# Altium footprint library 1.03-电容.PcbLib: 224 footprints (part 1 of 14)
Each footprint in its own frame and in the unit in brackets; x right, y up, seen from the top. Pads: shape width x height; smd on the part's side, far side on the other; paste and mask are expansions set on the pad; w line width, h text height; cw(c..) or ccw(c..) is an arc to the next point about the centre after c.
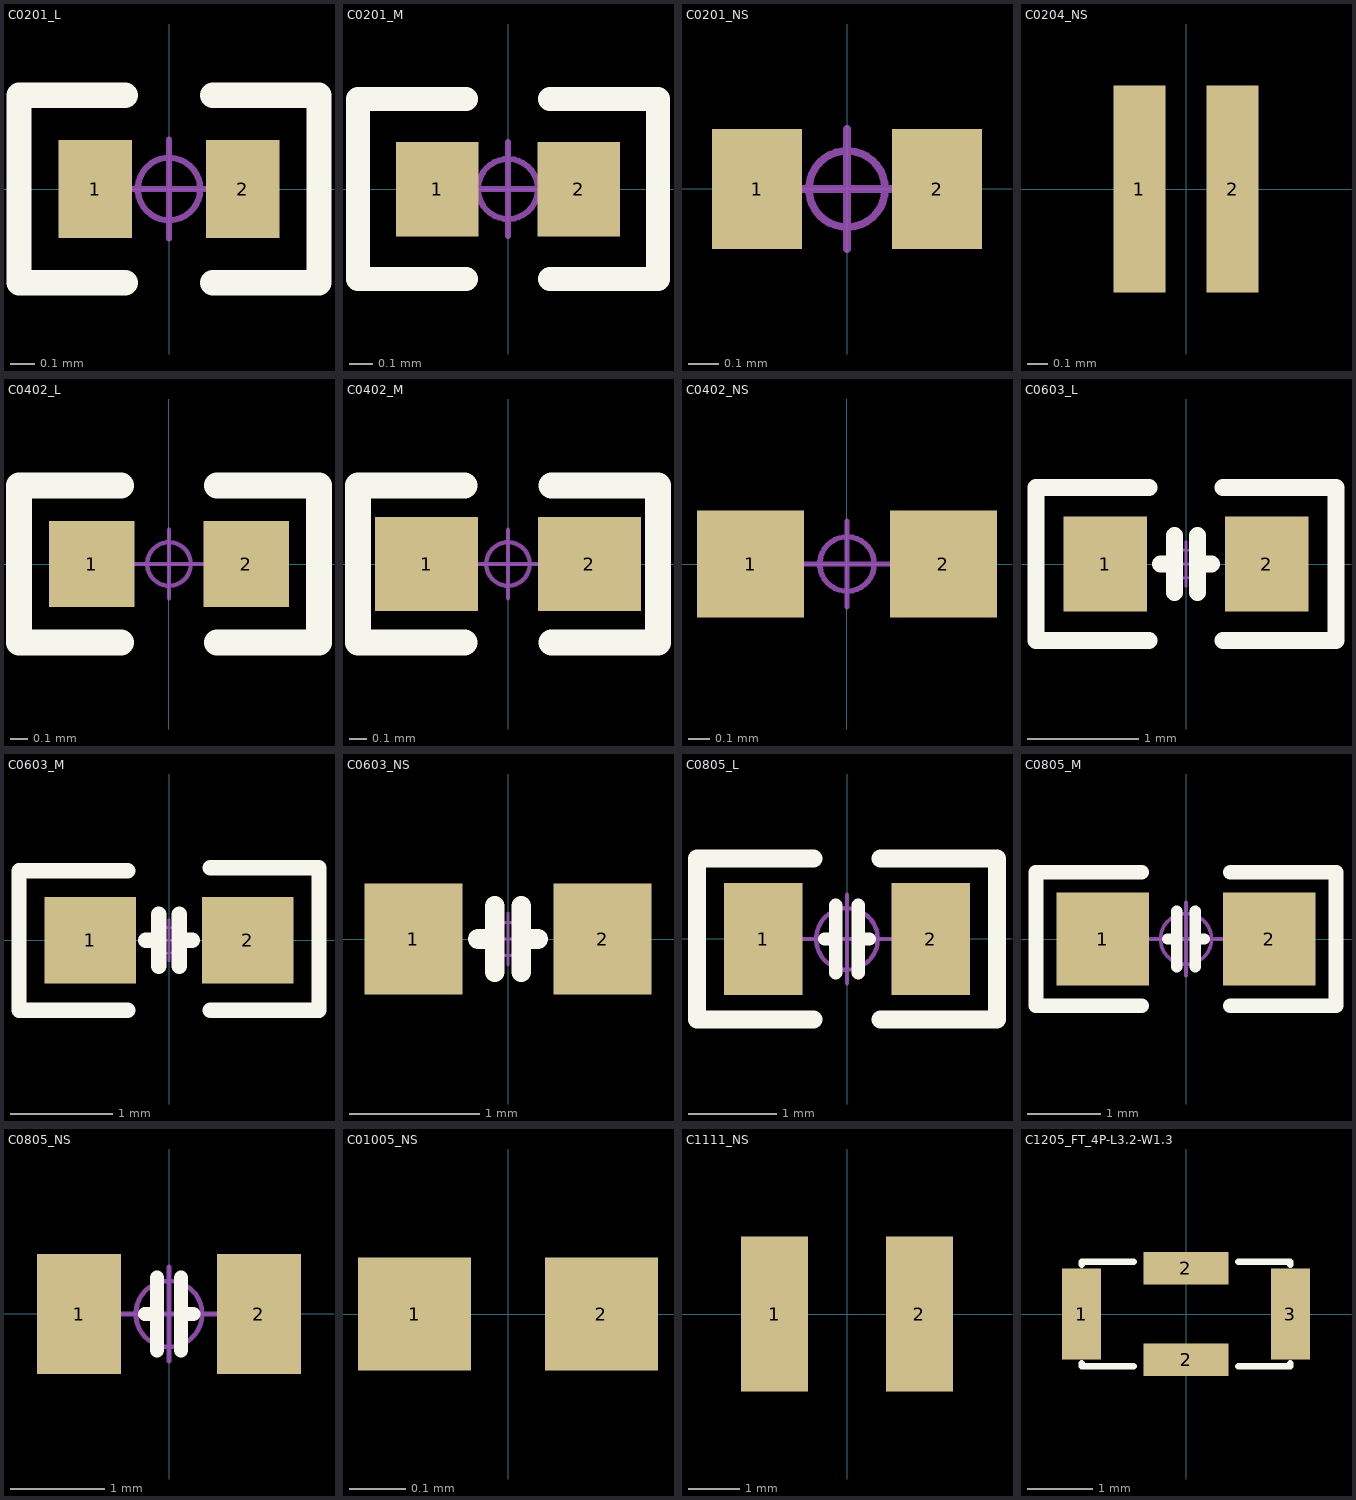
[diagram p0: the footprints below, top view; thin cyan lines are the x and y axes]

## C0201_L [mm] "贴片MLCC电容"
pads (2):
  rect 0.3x0.4 smd: 1(-0.3,0) 2(0.3,0)
Top Overlay:
  lines w0.102: -0.178,-0.381 -0.61,-0.381 -0.61,0.381 -0.178,0.381 ; 0.178,-0.381 0.61,-0.381 0.61,0.381 0.178,0.381
Mechanical 15:
  circle w0.025: c0,0 r0.127
  lines w0.025: -0.2,0 0.2,0 ; 0,-0.2 0,0.2
3D body "C0201-2S.stp": height 0.3, standoff 0, extent -0.3,-0.15 0.3,0.15

## C0201_M [mm] "贴片MLCC电容                联系卖家 免费查找封装"
pads (2):
  rect 0.35x0.4 smd: 1(-0.3,0) 2(0.3,0)
Top Overlay:
  lines w0.102: -0.178,-0.381 -0.635,-0.381 -0.635,0.381 -0.178,0.381 ; 0.178,-0.381 0.635,-0.381 0.635,0.381 0.178,0.381
Mechanical 15:
  circle w0.025: c0,0 r0.127
  lines w0.025: -0.2,0 0.2,0 ; 0,-0.2 0,0.2
3D body "C0201-2S.stp": height 0.3, standoff 0, extent -0.3,-0.15 0.3,0.15

## C0201_NS [mm] "贴片MLCC电容-无丝印              联系卖家 免费查找封装"
pads (2):
  rect 0.3x0.4 smd: 1(-0.3,0) 2(0.3,0)
Mechanical 15:
  circle w0.025: c0,0 r0.127
  lines w0.025: -0.2,0 0.2,0 ; 0,-0.2 0,0.2
3D body "C0201-2S.stp": height 0.3, standoff 0, extent -0.3,-0.15 0.3,0.15

## C0204_NS [mm] "贴片MLCC电容-无丝印                           淘宝ID:黄晶宝石"
pads (2):
  rect 0.25x1 smd mask+0.051: 1(-0.225,0) 2(0.225,0)
3D body "C0204H03-2S.stp": height 0.3, standoff 0, extent -0.25,-0.5 0.25,0.5

## C0402_L [mm] "贴片MLCC电容"
pads (2):
  rect 0.5x0.5 smd: 1(-0.45,0) 2(0.45,0)
Top Overlay:
  lines w0.152: -0.279,-0.457 -0.875,-0.457 -0.875,0.457 -0.279,0.457 ; 0.279,-0.457 0.875,-0.457 0.875,0.457 0.279,0.457
Mechanical 15:
  circle w0.025: c0,0 r0.127
  lines w0.025: -0.2,0 0.2,0 ; 0,-0.2 0,0.2
3D body "C0402-B-2S.stp": height 0.5, standoff 0, extent -0.5,-0.25 0.5,0.25

## C0402_M [mm] "贴片MLCC电容"
pads (2):
  rect 0.6x0.55 smd: 1(-0.475,0) 2(0.475,0)
Top Overlay:
  lines w0.152: -0.254,-0.457 -0.875,-0.457 -0.875,0.457 -0.254,0.457 ; 0.254,-0.457 0.875,-0.457 0.875,0.457 0.254,0.457
Mechanical 15:
  circle w0.025: c0,0 r0.127
  lines w0.025: -0.2,0 0.2,0 ; 0,-0.2 0,0.2
3D body "C0402-B-2S.stp": height 0.5, standoff 0, extent -0.5,-0.25 0.5,0.25

## C0402_NS [mm] "贴片MLCC电容-无丝印             联系卖家 免费查找封装"
pads (2):
  rect 0.5x0.5 smd: 1(-0.45,0) 2(0.45,0)
Mechanical 15:
  circle w0.025: c0,0 r0.127
  lines w0.025: -0.2,0 0.2,0 ; 0,-0.2 0,0.2
3D body "C0402-B-2S.stp": height 0.5, standoff 0, extent -0.5,-0.25 0.5,0.25

## C0603_L [mm] "贴片MLCC电容"
pads (2):
  rect 0.75x0.85 smd: 1(-0.725,0) 2(0.725,0)
Top Overlay:
  lines w0.152: -0.33,-0.686 -1.346,-0.686 -1.346,0.686 -0.33,0.686 ; -0.229,0 -0.102,0 ; -0.102,-0.254 -0.102,0.254 ; 0.102,-0.254 0.102,0.254 ; 0.102,0 0.229,0 ; 0.33,-0.686 1.346,-0.686 1.346,0.686 0.33,0.686
Mechanical 15:
  circle w0.025: c0,0 r0.127
  lines w0.025: -0.2,0 0.2,0 ; 0,-0.2 0,0.2
3D body "C0603H08-2S.stp": height 0.8, standoff 0, extent -0.8,-0.4 0.8,0.4

## C0603_M [mm] "贴片MLCC电容"
pads (2):
  rect 0.9x0.85 smd: 1(-0.775,0) 2(0.775,0)
Top Overlay:
  lines w0.152: -1.475,-0.686 -1.475,0.686 ; -1.473,-0.686 -0.406,-0.686 ; -1.473,0.686 -0.406,0.686 ; -0.229,0 -0.102,0 ; -0.102,-0.254 -0.102,0.254 ; 0.102,-0.254 0.102,0.254 ; 0.102,0 0.229,0 ; 0.406,-0.686 1.473,-0.686 ; 0.406,0.711 1.473,0.711 ; 1.475,-0.686 1.475,0.686
Mechanical 15:
  circle w0.025: c0,0 r0.127
  lines w0.025: -0.2,0 0.2,0 ; 0,-0.2 0,0.2
3D body "C0603H08-2S.stp": height 0.8, standoff 0, extent -0.8,-0.4 0.8,0.4

## C0603_NS [mm] "贴片MLCC电容-无丝印"
pads (2):
  rect 0.75x0.85 smd: 1(-0.725,0) 2(0.725,0)
Top Overlay:
  lines w0.152: -0.229,0 -0.102,0 ; -0.102,-0.254 -0.102,0.254 ; 0.102,-0.254 0.102,0.254 ; 0.102,0 0.229,0
Mechanical 15:
  circle w0.025: c0,0 r0.127
  lines w0.025: -0.2,0 0.2,0 ; 0,-0.2 0,0.2
3D body "C0603H08-2S.stp": height 0.8, standoff 0, extent -0.8,-0.4 0.8,0.4

## C0805_L [mil] "贴片MLCC电容"
height 19.68
pads (2):
  rect 35x50 smd: 1(-37.4,0) 2(37.4,0)
Top Overlay:
  lines w6: -10,0 -5,0 ; -5,-15 -5,15 ; 5,-15 5,15 ; 5,0 10,0
  lines w8: -15,-36 -66.93,-36 -66.93,36 -15,36 ; 15,-36 66.93,-36 66.93,36 15,36
Mechanical 15:
  circle w1.97: c0,0 r13.78
  circle w1.97: c0,0 r13.78
  lines w1.97: -19.68,0 19.68,0 -19.68,0 ; 0,-19.68 0,19.68 0,-19.68
3D body "C0805H13-2S.stp": height 51.18, standoff -0.04, extent -39.36,-25.58 39.38,25.6

## C0805_M [mil] "贴片MLCC电容"
height 19.68
pads (2):
  rect 50x50 smd: 1(-45,0) 2(45,0)
Top Overlay:
  lines w6: -10,0 -5,0 ; -5,-15 -5,15 ; 5,-15 5,15 ; 5,0 10,0
  lines w8: -24,-36 -81,-36 -81,36 -24,36 ; 24,-36 81,-36 81,36 24,36
Mechanical 15:
  circle w1.97: c0,0 r13.78
  lines w1.97: -19.68,0 19.68,0 ; 0,-19.68 0,19.68
3D body "C0805H13-2S.stp": height 51.18, standoff -0.04, extent -39.36,-25.58 39.38,25.6

## C0805_NS [mil] "贴片MLCC电容-无丝印"
height 19.68
pads (2):
  rect 35x50 smd: 1(-37.4,0) 2(37.4,0)
Top Overlay:
  lines w6: -10,0 -5,0 ; -5,-15 -5,15 ; 5,-15 5,15 ; 5,0 10,0
Mechanical 15:
  circle w1.97: c0,0 r13.78
  circle w1.97: c0,0 r13.78
  lines w1.97: -19.68,0 19.68,0 -19.68,0 ; 0,-19.68 0,19.68 0,-19.68
3D body "C0805H13-2S.stp": height 51.18, standoff -0.04, extent -39.36,-25.58 39.38,25.6

## C01005_NS [mm] "贴片MLCC电容-无丝印"
pads (2):
  rect 0.2x0.2 smd paste+0 mask+0: 1(-0.165,0) 2(0.165,0)
3D body "C01005H02-2S.stp": height 0.2, standoff 0, extent -0.199,-0.1 0.199,0.1

## C1111_NS [mm] "贴片MLCC电容-无丝印"
pads (2):
  rect 1.3x3 smd mask+0.051: 1(-1.4,0) 2(1.4,0)
3D body "C1111H26-2S.stp": height 2.6, standoff 0, extent -1.3,-1.399 1.5,1.4

## C1205_FT_4P-L3.2-W1.3 [mm] "贴片穿心电容馈通滤波器   封装库来自淘宝卖家ID：黄晶宝石"
pads (4):
  rect 0.6x1.4 smd: 1(-1.6,0) 3(1.6,0)
  rect 1.3x0.5 smd: 2(0,0.7) 2(0,-0.7)
Top Overlay:
  lines w0.102: -1.6,-0.755 -1.6,-0.8 -0.805,-0.8 ; -1.6,0.755 -1.6,0.8 -0.805,0.8 ; 0.805,-0.8 1.6,-0.8 1.6,-0.755 ; 0.805,0.8 1.6,0.8 1.6,0.755
3D body "C_FT.stp": height 0.7, standoff 0, extent -1.6,-0.65 1.6,0.6